# Altium schematic symbol library jlcpcb_2025_04_capacitors_extended_0402.schlib: 3594 symbols (part 8 of 20) (continued)
## CC0402JRX7R9BB151
designator C?  Capacitance: 150pF  (hidden comment: *)
Capacitor, Ceramic (MLCC), 150pF, ±5%, 50V, X7R, ±5%, SMD 0402; Manufacturer: YAGEO; Manufacturer Part Number: CC0402JRX7R9BB151; Package Size: 0402; JLCPCB Basic Part: No; JLCPCB Part Number: C541446; Supplier 1: LCSC; Category: Capacitors - MLCC; Supplier Part Number 1: C541446; Tolerance: ±5%; Voltage Rating: 50V; Temperature Coefficient: X7R; RoHS: Yes; ComponentLink1Description: Datasheet; ComponentLink1URL: https://wmsc.lcsc.com/wmsc/upload/file/pdf/v2/lcsc/2006151136_YAGEO-CC0402JRX7R9BB151_C541446.pdf; ComponentLink2Description: JLCPCB Part URL; ComponentLink2URL: https://jlcpcb.com/partdetail/C541446; ComponentLink3Description: LCSC Part URL; ComponentLink3URL: https://lcsc.com/product-detail/Multilayer-Ceramic-Capacitors-MLCC---SMD-SMT_YAGEO-YAGEO-CC0402JRX7R9BB151_C541446.html
footprint CAP-0402 (0402 (1005M) Capacitor)
pins: 1, 2

## CC0402JRX7R9BB152
designator C?  Capacitance: 1.5nF  (hidden comment: *)
Capacitor, Ceramic (MLCC), 1.5nF, ±5%, 50V, X7R, ±5%, SMD 0402; Manufacturer: YAGEO; Manufacturer Part Number: CC0402JRX7R9BB152; Package Size: 0402; JLCPCB Basic Part: No; JLCPCB Part Number: C281752; Supplier 1: LCSC; Category: Capacitors - MLCC; Supplier Part Number 1: C281752; Tolerance: ±5%; Voltage Rating: 50V; Temperature Coefficient: X7R; RoHS: Yes; ComponentLink1Description: Datasheet; ComponentLink1URL: https://wmsc.lcsc.com/wmsc/upload/file/pdf/v2/lcsc/2304140030_YAGEO-CC0402JRX7R9BB152_C281752.pdf; ComponentLink2Description: JLCPCB Part URL; ComponentLink2URL: https://jlcpcb.com/partdetail/C281752; ComponentLink3Description: LCSC Part URL; ComponentLink3URL: https://lcsc.com/product-detail/Multilayer-Ceramic-Capacitors-MLCC---SMD-SMT_YAGEO-YAGEO-CC0402JRX7R9BB152_C281752.html
footprint CAP-0402 (0402 (1005M) Capacitor)
pins: 1, 2

## CC0402JRX7R9BB153
designator C?  Capacitance: 15000pF  (hidden comment: *)
Capacitor, Ceramic (MLCC), 15000pF, null, SMD 0402; Manufacturer: YAGEO; Manufacturer Part Number: CC0402JRX7R9BB153; Package Size: 0402; JLCPCB Basic Part: No; JLCPCB Part Number: C5182422; Supplier 1: LCSC; Category: Capacitors - MLCC; Supplier Part Number 1: C5182422; Voltage Rating: null; RoHS: Yes; ComponentLink1Description: Datasheet; ComponentLink1URL: https://wmsc.lcsc.com/wmsc/upload/file/pdf/v2/lcsc/2211281000_YAGEO-CC0402JRX7R9BB153_C5182422.pdf; ComponentLink2Description: JLCPCB Part URL; ComponentLink2URL: https://jlcpcb.com/partdetail/C5182422; ComponentLink3Description: LCSC Part URL; ComponentLink3URL: https://lcsc.com/product-detail/Multilayer-Ceramic-Capacitors-MLCC---SMD-SMT_YAGEO-YAGEO-CC0402JRX7R9BB153_C5182422.html
footprint CAP-0402 (0402 (1005M) Capacitor)
pins: 1, 2

## CC0402JRX7R9BB182
designator C?  Capacitance: 1.8nF  (hidden comment: *)
Capacitor, Ceramic (MLCC), 1.8nF, ±5%, 50V, X7R, ±5%, SMD 0402; Manufacturer: YAGEO; Manufacturer Part Number: CC0402JRX7R9BB182; Package Size: 0402; JLCPCB Basic Part: No; JLCPCB Part Number: C527007; Supplier 1: LCSC; Category: Capacitors - MLCC; Supplier Part Number 1: C527007; Tolerance: ±5%; Voltage Rating: 50V; Temperature Coefficient: X7R; RoHS: Yes; ComponentLink1Description: Datasheet; ComponentLink1URL: https://wmsc.lcsc.com/wmsc/upload/file/pdf/v2/lcsc/2008061533_YAGEO-CC0402JRX7R9BB182_C527007.pdf; ComponentLink2Description: JLCPCB Part URL; ComponentLink2URL: https://jlcpcb.com/partdetail/C527007; ComponentLink3Description: LCSC Part URL; ComponentLink3URL: https://lcsc.com/product-detail/Multilayer-Ceramic-Capacitors-MLCC---SMD-SMT_YAGEO-YAGEO-CC0402JRX7R9BB182_C527007.html
footprint CAP-0402 (0402 (1005M) Capacitor)
pins: 1, 2

## CC0402JRX7R9BB202
designator C?  Capacitance: 2nF  (hidden comment: *)
Capacitor, Ceramic (MLCC), 2nF, ±5%, 50V, X7R, ±5%, SMD 0402; Manufacturer: YAGEO; Manufacturer Part Number: CC0402JRX7R9BB202; Package Size: 0402; JLCPCB Basic Part: No; JLCPCB Part Number: C541458; Supplier 1: LCSC; Category: Capacitors - MLCC; Supplier Part Number 1: C541458; Tolerance: ±5%; Voltage Rating: 50V; Temperature Coefficient: X7R; RoHS: Yes; ComponentLink1Description: Datasheet; ComponentLink1URL: https://wmsc.lcsc.com/wmsc/upload/file/pdf/v2/lcsc/2006151137_YAGEO-CC0402JRX7R9BB202_C541458.pdf; ComponentLink2Description: JLCPCB Part URL; ComponentLink2URL: https://jlcpcb.com/partdetail/C541458; ComponentLink3Description: LCSC Part URL; ComponentLink3URL: https://lcsc.com/product-detail/Multilayer-Ceramic-Capacitors-MLCC---SMD-SMT_YAGEO-YAGEO-CC0402JRX7R9BB202_C541458.html
footprint CAP-0402 (0402 (1005M) Capacitor)
pins: 1, 2

## CC0402JRX7R9BB222
designator C?  Capacitance: 2.2nF  (hidden comment: *)
Capacitor, Ceramic (MLCC), 2.2nF, ±5%, 50V, X7R, ±5%, SMD 0402; Manufacturer: YAGEO; Manufacturer Part Number: CC0402JRX7R9BB222; Package Size: 0402; JLCPCB Basic Part: No; JLCPCB Part Number: C513667; Supplier 1: LCSC; Category: Capacitors - MLCC; Supplier Part Number 1: C513667; Tolerance: ±5%; Voltage Rating: 50V; Temperature Coefficient: X7R; RoHS: Yes; ComponentLink1Description: Datasheet; ComponentLink1URL: https://wmsc.lcsc.com/wmsc/upload/file/pdf/v2/lcsc/2004231433_YAGEO-CC0402JRX7R9BB222_C513667.pdf; ComponentLink2Description: JLCPCB Part URL; ComponentLink2URL: https://jlcpcb.com/partdetail/C513667; ComponentLink3Description: LCSC Part URL; ComponentLink3URL: https://lcsc.com/product-detail/Multilayer-Ceramic-Capacitors-MLCC---SMD-SMT_YAGEO-YAGEO-CC0402JRX7R9BB222_C513667.html
footprint CAP-0402 (0402 (1005M) Capacitor)
pins: 1, 2

## CC0402JRX7R9BB223
designator C?  Capacitance: 22nF  (hidden comment: *)
Capacitor, Ceramic (MLCC), 22nF, ±5%, 50V, X7R, ±5%, SMD 0402; Manufacturer: YAGEO; Manufacturer Part Number: CC0402JRX7R9BB223; Package Size: 0402; JLCPCB Basic Part: No; JLCPCB Part Number: C541460; Supplier 1: LCSC; Category: Capacitors - MLCC; Supplier Part Number 1: C541460; Tolerance: ±5%; Voltage Rating: 50V; Temperature Coefficient: X7R; RoHS: Yes; ComponentLink1Description: Datasheet; ComponentLink1URL: https://wmsc.lcsc.com/wmsc/upload/file/pdf/v2/lcsc/2006151138_YAGEO-CC0402JRX7R9BB223_C541460.pdf; ComponentLink2Description: JLCPCB Part URL; ComponentLink2URL: https://jlcpcb.com/partdetail/C541460; ComponentLink3Description: LCSC Part URL; ComponentLink3URL: https://lcsc.com/product-detail/Multilayer-Ceramic-Capacitors-MLCC---SMD-SMT_YAGEO-YAGEO-CC0402JRX7R9BB223_C541460.html
footprint CAP-0402 (0402 (1005M) Capacitor)
pins: 1, 2

## CC0402JRX7R9BB271
designator C?  Capacitance: 270pF  (hidden comment: *)
Capacitor, Ceramic (MLCC), 270pF, ±5%, 50V, X7R, ±5%, SMD 0402; Manufacturer: YAGEO; Manufacturer Part Number: CC0402JRX7R9BB271; Package Size: 0402; JLCPCB Basic Part: No; JLCPCB Part Number: C541454; Supplier 1: LCSC; Category: Capacitors - MLCC; Supplier Part Number 1: C541454; Tolerance: ±5%; Voltage Rating: 50V; Temperature Coefficient: X7R; RoHS: Yes; ComponentLink1Description: Datasheet; ComponentLink1URL: https://wmsc.lcsc.com/wmsc/upload/file/pdf/v2/lcsc/2006151137_YAGEO-CC0402JRX7R9BB271_C541454.pdf; ComponentLink2Description: JLCPCB Part URL; ComponentLink2URL: https://jlcpcb.com/partdetail/C541454; ComponentLink3Description: LCSC Part URL; ComponentLink3URL: https://lcsc.com/product-detail/Multilayer-Ceramic-Capacitors-MLCC---SMD-SMT_YAGEO-YAGEO-CC0402JRX7R9BB271_C541454.html
footprint CAP-0402 (0402 (1005M) Capacitor)
pins: 1, 2

## CC0402JRX7R9BB272
designator C?  Capacitance: 2.7nF  (hidden comment: *)
Capacitor, Ceramic (MLCC), 2.7nF, ±5%, 50V, X7R, ±5%, SMD 0402; Manufacturer: YAGEO; Manufacturer Part Number: CC0402JRX7R9BB272; Package Size: 0402; JLCPCB Basic Part: No; JLCPCB Part Number: C327272; Supplier 1: LCSC; Category: Capacitors - MLCC; Supplier Part Number 1: C327272; Tolerance: ±5%; Voltage Rating: 50V; Temperature Coefficient: X7R; RoHS: Yes; ComponentLink1Description: Datasheet; ComponentLink1URL: https://wmsc.lcsc.com/wmsc/upload/file/pdf/v2/lcsc/2311211121_YAGEO-CC0402JRX7R9BB272_C327272.pdf; ComponentLink2Description: JLCPCB Part URL; ComponentLink2URL: https://jlcpcb.com/partdetail/C327272; ComponentLink3Description: LCSC Part URL; ComponentLink3URL: https://lcsc.com/product-detail/Multilayer-Ceramic-Capacitors-MLCC---SMD-SMT_YAGEO-YAGEO-CC0402JRX7R9BB272_C327272.html
footprint CAP-0402 (0402 (1005M) Capacitor)
pins: 1, 2

## CC0402JRX7R9BB331
designator C?  Capacitance: 330pF  (hidden comment: *)
Capacitor, Ceramic (MLCC), 330pF, ±5%, 50V, X7R, ±5%, SMD 0402; Manufacturer: YAGEO; Manufacturer Part Number: CC0402JRX7R9BB331; Package Size: 0402; JLCPCB Basic Part: No; JLCPCB Part Number: C325463; Supplier 1: LCSC; Category: Capacitors - MLCC; Supplier Part Number 1: C325463; Tolerance: ±5%; Voltage Rating: 50V; Temperature Coefficient: X7R; RoHS: Yes; ComponentLink1Description: Datasheet; ComponentLink1URL: https://wmsc.lcsc.com/wmsc/upload/file/pdf/v2/lcsc/1811070918_YAGEO-CC0402JRX7R9BB331_C325463.pdf; ComponentLink2Description: JLCPCB Part URL; ComponentLink2URL: https://jlcpcb.com/partdetail/C325463; ComponentLink3Description: LCSC Part URL; ComponentLink3URL: https://lcsc.com/product-detail/Multilayer-Ceramic-Capacitors-MLCC---SMD-SMT_YAGEO-YAGEO-CC0402JRX7R9BB331_C325463.html
footprint CAP-0402 (0402 (1005M) Capacitor)
pins: 1, 2

## CC0402JRX7R9BB332
designator C?  Capacitance: 3.3nF  (hidden comment: *)
Capacitor, Ceramic (MLCC), 3.3nF, ±5%, 50V, X7R, ±5%, SMD 0402; Manufacturer: YAGEO; Manufacturer Part Number: CC0402JRX7R9BB332; Package Size: 0402; JLCPCB Basic Part: No; JLCPCB Part Number: C541447; Supplier 1: LCSC; Category: Capacitors - MLCC; Supplier Part Number 1: C541447; Tolerance: ±5%; Voltage Rating: 50V; Temperature Coefficient: X7R; RoHS: Yes; ComponentLink1Description: Datasheet; ComponentLink1URL: https://wmsc.lcsc.com/wmsc/upload/file/pdf/v2/lcsc/2006151136_YAGEO-CC0402JRX7R9BB332_C541447.pdf; ComponentLink2Description: JLCPCB Part URL; ComponentLink2URL: https://jlcpcb.com/partdetail/C541447; ComponentLink3Description: LCSC Part URL; ComponentLink3URL: https://lcsc.com/product-detail/Multilayer-Ceramic-Capacitors-MLCC---SMD-SMT_YAGEO-YAGEO-CC0402JRX7R9BB332_C541447.html
footprint CAP-0402 (0402 (1005M) Capacitor)
pins: 1, 2

## CC0402JRX7R9BB333
designator C?  Capacitance: 33nF  (hidden comment: *)
Capacitor, Ceramic (MLCC), 33nF, ±5%, 50V, X7R, ±5%, SMD 0402; Manufacturer: YAGEO; Manufacturer Part Number: CC0402JRX7R9BB333; Package Size: 0402; JLCPCB Basic Part: No; JLCPCB Part Number: C541463; Supplier 1: LCSC; Category: Capacitors - MLCC; Supplier Part Number 1: C541463; Tolerance: ±5%; Voltage Rating: 50V; Temperature Coefficient: X7R; RoHS: Yes; ComponentLink1Description: Datasheet; ComponentLink1URL: https://wmsc.lcsc.com/wmsc/upload/file/pdf/v2/lcsc/2006151138_YAGEO-CC0402JRX7R9BB333_C541463.pdf; ComponentLink2Description: JLCPCB Part URL; ComponentLink2URL: https://jlcpcb.com/partdetail/C541463; ComponentLink3Description: LCSC Part URL; ComponentLink3URL: https://lcsc.com/product-detail/Multilayer-Ceramic-Capacitors-MLCC---SMD-SMT_YAGEO-YAGEO-CC0402JRX7R9BB333_C541463.html
footprint CAP-0402 (0402 (1005M) Capacitor)
pins: 1, 2

## CC0402JRX7R9BB391
designator C?  Capacitance: 390pF  (hidden comment: *)
Capacitor, Ceramic (MLCC), 390pF, ±5%, 50V, X7R, ±5%, SMD 0402; Manufacturer: YAGEO; Manufacturer Part Number: CC0402JRX7R9BB391; Package Size: 0402; JLCPCB Basic Part: No; JLCPCB Part Number: C527008; Supplier 1: LCSC; Category: Capacitors - MLCC; Supplier Part Number 1: C527008; Tolerance: ±5%; Voltage Rating: 50V; Temperature Coefficient: X7R; RoHS: Yes; ComponentLink1Description: Datasheet; ComponentLink1URL: https://wmsc.lcsc.com/wmsc/upload/file/pdf/v2/lcsc/2006101834_YAGEO-CC0402JRX7R9BB391_C527008.pdf; ComponentLink2Description: JLCPCB Part URL; ComponentLink2URL: https://jlcpcb.com/partdetail/C527008; ComponentLink3Description: LCSC Part URL; ComponentLink3URL: https://lcsc.com/product-detail/Multilayer-Ceramic-Capacitors-MLCC---SMD-SMT_YAGEO-YAGEO-CC0402JRX7R9BB391_C527008.html
footprint CAP-0402 (0402 (1005M) Capacitor)
pins: 1, 2

## CC0402JRX7R9BB392
designator C?  Capacitance: 3.9nF  (hidden comment: *)
Capacitor, Ceramic (MLCC), 3.9nF, ±5%, 50V, X7R, ±5%, SMD 0402; Manufacturer: YAGEO; Manufacturer Part Number: CC0402JRX7R9BB392; Package Size: 0402; JLCPCB Basic Part: No; JLCPCB Part Number: C541455; Supplier 1: LCSC; Category: Capacitors - MLCC; Supplier Part Number 1: C541455; Tolerance: ±5%; Voltage Rating: 50V; Temperature Coefficient: X7R; RoHS: Yes; ComponentLink1Description: Datasheet; ComponentLink1URL: https://wmsc.lcsc.com/wmsc/upload/file/pdf/v2/lcsc/2006151137_YAGEO-CC0402JRX7R9BB392_C541455.pdf; ComponentLink2Description: JLCPCB Part URL; ComponentLink2URL: https://jlcpcb.com/partdetail/C541455; ComponentLink3Description: LCSC Part URL; ComponentLink3URL: https://lcsc.com/product-detail/Multilayer-Ceramic-Capacitors-MLCC---SMD-SMT_YAGEO-YAGEO-CC0402JRX7R9BB392_C541455.html
footprint CAP-0402 (0402 (1005M) Capacitor)
pins: 1, 2

## CC0402JRX7R9BB471
designator C?  Capacitance: 470pF  (hidden comment: *)
Capacitor, Ceramic (MLCC), 470pF, ±5%, 50V, X7R, ±5%, SMD 0402; Manufacturer: YAGEO; Manufacturer Part Number: CC0402JRX7R9BB471; Package Size: 0402; JLCPCB Basic Part: No; JLCPCB Part Number: C272887; Supplier 1: LCSC; Category: Capacitors - MLCC; Supplier Part Number 1: C272887; Tolerance: ±5%; Voltage Rating: 50V; Temperature Coefficient: X7R; RoHS: Yes; ComponentLink1Description: Datasheet; ComponentLink1URL: https://wmsc.lcsc.com/wmsc/upload/file/pdf/v2/lcsc/2304140030_YAGEO-CC0402JRX7R9BB471_C272887.pdf; ComponentLink2Description: JLCPCB Part URL; ComponentLink2URL: https://jlcpcb.com/partdetail/C272887; ComponentLink3Description: LCSC Part URL; ComponentLink3URL: https://lcsc.com/product-detail/Multilayer-Ceramic-Capacitors-MLCC---SMD-SMT_YAGEO-YAGEO-CC0402JRX7R9BB471_C272887.html
footprint CAP-0402 (0402 (1005M) Capacitor)
pins: 1, 2

## CC0402JRX7R9BB472
designator C?  Capacitance: 4.7nF  (hidden comment: *)
Capacitor, Ceramic (MLCC), 4.7nF, ±5%, 50V, X7R, ±5%, SMD 0402; Manufacturer: YAGEO; Manufacturer Part Number: CC0402JRX7R9BB472; Package Size: 0402; JLCPCB Basic Part: No; JLCPCB Part Number: C281757; Supplier 1: LCSC; Category: Capacitors - MLCC; Supplier Part Number 1: C281757; Tolerance: ±5%; Voltage Rating: 50V; Temperature Coefficient: X7R; RoHS: Yes; ComponentLink1Description: Datasheet; ComponentLink1URL: https://wmsc.lcsc.com/wmsc/upload/file/pdf/v2/lcsc/2304140030_YAGEO-CC0402JRX7R9BB472_C281757.pdf; ComponentLink2Description: JLCPCB Part URL; ComponentLink2URL: https://jlcpcb.com/partdetail/C281757; ComponentLink3Description: LCSC Part URL; ComponentLink3URL: https://lcsc.com/product-detail/Multilayer-Ceramic-Capacitors-MLCC---SMD-SMT_YAGEO-YAGEO-CC0402JRX7R9BB472_C281757.html
footprint CAP-0402 (0402 (1005M) Capacitor)
pins: 1, 2

## CC0402JRX7R9BB473
designator C?  Capacitance: 47nF  (hidden comment: *)
Capacitor, Ceramic (MLCC), 47nF, ±5%, 50V, X7R, ±5%, SMD 0402; Manufacturer: YAGEO; Manufacturer Part Number: CC0402JRX7R9BB473; Package Size: 0402; JLCPCB Basic Part: No; JLCPCB Part Number: C576715; Supplier 1: LCSC; Category: Capacitors - MLCC; Supplier Part Number 1: C576715; Tolerance: ±5%; Voltage Rating: 50V; Temperature Coefficient: X7R; RoHS: Yes; ComponentLink1Description: Datasheet; ComponentLink1URL: https://wmsc.lcsc.com/wmsc/upload/file/pdf/v2/lcsc/2205071500_YAGEO-CC0402JRX7R9BB473_C576715.pdf; ComponentLink2Description: JLCPCB Part URL; ComponentLink2URL: https://jlcpcb.com/partdetail/C576715; ComponentLink3Description: LCSC Part URL; ComponentLink3URL: https://lcsc.com/product-detail/Multilayer-Ceramic-Capacitors-MLCC---SMD-SMT_YAGEO-YAGEO-CC0402JRX7R9BB473_C576715.html
footprint CAP-0402 (0402 (1005M) Capacitor)
pins: 1, 2

## CC0402JRX7R9BB561
designator C?  Capacitance: 560pF  (hidden comment: *)
Capacitor, Ceramic (MLCC), 560pF, ±5%, 50V, X7R, ±5%, SMD 0402; Manufacturer: YAGEO; Manufacturer Part Number: CC0402JRX7R9BB561; Package Size: 0402; JLCPCB Basic Part: No; JLCPCB Part Number: C541456; Supplier 1: LCSC; Category: Capacitors - MLCC; Supplier Part Number 1: C541456; Tolerance: ±5%; Voltage Rating: 50V; Temperature Coefficient: X7R; RoHS: Yes; ComponentLink1Description: Datasheet; ComponentLink1URL: https://wmsc.lcsc.com/wmsc/upload/file/pdf/v2/lcsc/2006151137_YAGEO-CC0402JRX7R9BB561_C541456.pdf; ComponentLink2Description: JLCPCB Part URL; ComponentLink2URL: https://jlcpcb.com/partdetail/C541456; ComponentLink3Description: LCSC Part URL; ComponentLink3URL: https://lcsc.com/product-detail/Multilayer-Ceramic-Capacitors-MLCC---SMD-SMT_YAGEO-YAGEO-CC0402JRX7R9BB561_C541456.html
footprint CAP-0402 (0402 (1005M) Capacitor)
pins: 1, 2

## CC0402JRX7R9BB562
designator C?  Capacitance: 5.6nF  (hidden comment: *)
Capacitor, Ceramic (MLCC), 5.6nF, ±5%, 50V, X7R, ±5%, SMD 0402; Manufacturer: YAGEO; Manufacturer Part Number: CC0402JRX7R9BB562; Package Size: 0402; JLCPCB Basic Part: No; JLCPCB Part Number: C513725; Supplier 1: LCSC; Category: Capacitors - MLCC; Supplier Part Number 1: C513725; Tolerance: ±5%; Voltage Rating: 50V; Temperature Coefficient: X7R; RoHS: Yes; ComponentLink1Description: Datasheet; ComponentLink1URL: https://wmsc.lcsc.com/wmsc/upload/file/pdf/v2/lcsc/2004231434_YAGEO-CC0402JRX7R9BB562_C513725.pdf; ComponentLink2Description: JLCPCB Part URL; ComponentLink2URL: https://jlcpcb.com/partdetail/C513725; ComponentLink3Description: LCSC Part URL; ComponentLink3URL: https://lcsc.com/product-detail/Multilayer-Ceramic-Capacitors-MLCC---SMD-SMT_YAGEO-YAGEO-CC0402JRX7R9BB562_C513725.html
footprint CAP-0402 (0402 (1005M) Capacitor)
pins: 1, 2

## CC0402JRX7R9BB681
designator C?  Capacitance: 680pF  (hidden comment: *)
Capacitor, Ceramic (MLCC), 680pF, ±5%, 50V, X7R, ±5%, SMD 0402; Manufacturer: YAGEO; Manufacturer Part Number: CC0402JRX7R9BB681; Package Size: 0402; JLCPCB Basic Part: No; JLCPCB Part Number: C513560; Supplier 1: LCSC; Category: Capacitors - MLCC; Supplier Part Number 1: C513560; Tolerance: ±5%; Voltage Rating: 50V; Temperature Coefficient: X7R; RoHS: Yes; ComponentLink1Description: Datasheet; ComponentLink1URL: https://wmsc.lcsc.com/wmsc/upload/file/pdf/v2/lcsc/2005142147_YAGEO-CC0402JRX7R9BB681_C513560.pdf; ComponentLink2Description: JLCPCB Part URL; ComponentLink2URL: https://jlcpcb.com/partdetail/C513560; ComponentLink3Description: LCSC Part URL; ComponentLink3URL: https://lcsc.com/product-detail/Multilayer-Ceramic-Capacitors-MLCC---SMD-SMT_YAGEO-YAGEO-CC0402JRX7R9BB681_C513560.html
footprint CAP-0402 (0402 (1005M) Capacitor)
pins: 1, 2

## CC0402JRX7R9BB821
designator C?  Capacitance: 820pF  (hidden comment: *)
Capacitor, Ceramic (MLCC), 820pF, ±5%, 50V, X7R, ±5%, SMD 0402; Manufacturer: YAGEO; Manufacturer Part Number: CC0402JRX7R9BB821; Package Size: 0402; JLCPCB Basic Part: No; JLCPCB Part Number: C114386; Supplier 1: LCSC; Category: Capacitors - MLCC; Supplier Part Number 1: C114386; Tolerance: ±5%; Voltage Rating: 50V; Temperature Coefficient: X7R; RoHS: Yes; ComponentLink1Description: Datasheet; ComponentLink1URL: https://wmsc.lcsc.com/wmsc/upload/file/pdf/v2/lcsc/2304140030_YAGEO-CC0402JRX7R9BB821_C114386.pdf; ComponentLink2Description: JLCPCB Part URL; ComponentLink2URL: https://jlcpcb.com/partdetail/C114386; ComponentLink3Description: LCSC Part URL; ComponentLink3URL: https://lcsc.com/product-detail/Multilayer-Ceramic-Capacitors-MLCC---SMD-SMT_YAGEO-YAGEO-CC0402JRX7R9BB821_C114386.html
footprint CAP-0402 (0402 (1005M) Capacitor)
pins: 1, 2

## CC0402JRX7R9BB822
designator C?  Capacitance: 8.2nF  (hidden comment: *)
Capacitor, Ceramic (MLCC), 8.2nF, ±5%, 50V, X7R, ±5%, SMD 0402; Manufacturer: YAGEO; Manufacturer Part Number: CC0402JRX7R9BB822; Package Size: 0402; JLCPCB Basic Part: No; JLCPCB Part Number: C541457; Supplier 1: LCSC; Category: Capacitors - MLCC; Supplier Part Number 1: C541457; Tolerance: ±5%; Voltage Rating: 50V; Temperature Coefficient: X7R; RoHS: Yes; ComponentLink1Description: Datasheet; ComponentLink1URL: https://wmsc.lcsc.com/wmsc/upload/file/pdf/v2/lcsc/2006151137_YAGEO-CC0402JRX7R9BB822_C541457.pdf; ComponentLink2Description: JLCPCB Part URL; ComponentLink2URL: https://jlcpcb.com/partdetail/C541457; ComponentLink3Description: LCSC Part URL; ComponentLink3URL: https://lcsc.com/product-detail/Multilayer-Ceramic-Capacitors-MLCC---SMD-SMT_YAGEO-YAGEO-CC0402JRX7R9BB822_C541457.html
footprint CAP-0402 (0402 (1005M) Capacitor)
pins: 1, 2

## CC0402KRNPO7BN100
designator C?  Capacitance: 10pF  (hidden comment: *)
Capacitor, Ceramic (MLCC), 10pF, ±10%, 16V, NP0, ±10%, SMD 0402; Manufacturer: YAGEO; Manufacturer Part Number: CC0402KRNPO7BN100; Package Size: 0402; JLCPCB Basic Part: No; JLCPCB Part Number: C2168196; Supplier 1: LCSC; Category: Capacitors - MLCC; Supplier Part Number 1: C2168196; Tolerance: ±10%; Voltage Rating: 16V; Temperature Coefficient: NP0; RoHS: Yes; ComponentLink1Description: Datasheet; ComponentLink1URL: https://wmsc.lcsc.com/wmsc/upload/file/pdf/v2/lcsc/2202040300_YAGEO-CC0402KRNPO7BN100_C2168196.pdf; ComponentLink2Description: JLCPCB Part URL; ComponentLink2URL: https://jlcpcb.com/partdetail/C2168196; ComponentLink3Description: LCSC Part URL; ComponentLink3URL: https://lcsc.com/product-detail/Multilayer-Ceramic-Capacitors-MLCC---SMD-SMT_YAGEO-YAGEO-CC0402KRNPO7BN100_C2168196.html
footprint CAP-0402 (0402 (1005M) Capacitor)
pins: 1, 2

## CC0402KRNPO7BN150
designator C?  Capacitance: 15pF  (hidden comment: *)
Capacitor, Ceramic (MLCC), 15pF, ±10%, 16V, NP0, ±10%, SMD 0402; Manufacturer: YAGEO; Manufacturer Part Number: CC0402KRNPO7BN150; Package Size: 0402; JLCPCB Basic Part: No; JLCPCB Part Number: C1852854; Supplier 1: LCSC; Category: Capacitors - MLCC; Supplier Part Number 1: C1852854; Tolerance: ±10%; Voltage Rating: 16V; Temperature Coefficient: NP0; RoHS: Yes; ComponentLink1Description: Datasheet; ComponentLink1URL: https://wmsc.lcsc.com/wmsc/upload/file/pdf/v2/lcsc/2201271000_YAGEO-CC0402KRNPO7BN150_C1852854.pdf; ComponentLink2Description: JLCPCB Part URL; ComponentLink2URL: https://jlcpcb.com/partdetail/C1852854; ComponentLink3Description: LCSC Part URL; ComponentLink3URL: https://lcsc.com/product-detail/Multilayer-Ceramic-Capacitors-MLCC---SMD-SMT_YAGEO-YAGEO-CC0402KRNPO7BN150_C1852854.html
footprint CAP-0402 (0402 (1005M) Capacitor)
pins: 1, 2

## CC0402KRNPO8BN100
designator C?  Capacitance: 10pF  (hidden comment: *)
Capacitor, Ceramic (MLCC), 10pF, ±10%, 25V, NP0, ±10%, SMD 0402; Manufacturer: YAGEO; Manufacturer Part Number: CC0402KRNPO8BN100; Package Size: 0402; JLCPCB Basic Part: No; JLCPCB Part Number: C2168222; Supplier 1: LCSC; Category: Capacitors - MLCC; Supplier Part Number 1: C2168222; Tolerance: ±10%; Voltage Rating: 25V; Temperature Coefficient: NP0; RoHS: Yes; ComponentLink1Description: Datasheet; ComponentLink1URL: https://wmsc.lcsc.com/wmsc/upload/file/pdf/v2/lcsc/2202040300_YAGEO-CC0402KRNPO8BN100_C2168222.pdf; ComponentLink2Description: JLCPCB Part URL; ComponentLink2URL: https://jlcpcb.com/partdetail/C2168222; ComponentLink3Description: LCSC Part URL; ComponentLink3URL: https://lcsc.com/product-detail/Multilayer-Ceramic-Capacitors-MLCC---SMD-SMT_YAGEO-YAGEO-CC0402KRNPO8BN100_C2168222.html
footprint CAP-0402 (0402 (1005M) Capacitor)
pins: 1, 2

## CC0402KRNPO8BN220
designator C?  Capacitance: 22pF  (hidden comment: *)
Capacitor, Ceramic (MLCC), 22pF, ±10%, 25V, NP0, ±10%, SMD 0402; Manufacturer: YAGEO; Manufacturer Part Number: CC0402KRNPO8BN220; Package Size: 0402; JLCPCB Basic Part: No; JLCPCB Part Number: C1852900; Supplier 1: LCSC; Category: Capacitors - MLCC; Supplier Part Number 1: C1852900; Tolerance: ±10%; Voltage Rating: 25V; Temperature Coefficient: NP0; RoHS: Yes; ComponentLink1Description: Datasheet; ComponentLink1URL: https://wmsc.lcsc.com/wmsc/upload/file/pdf/v2/lcsc/2201271030_YAGEO-CC0402KRNPO8BN220_C1852900.pdf; ComponentLink2Description: JLCPCB Part URL; ComponentLink2URL: https://jlcpcb.com/partdetail/C1852900; ComponentLink3Description: LCSC Part URL; ComponentLink3URL: https://lcsc.com/product-detail/Multilayer-Ceramic-Capacitors-MLCC---SMD-SMT_YAGEO-YAGEO-CC0402KRNPO8BN220_C1852900.html
footprint CAP-0402 (0402 (1005M) Capacitor)
pins: 1, 2

## CC0402KRNPO9BN100
designator C?  Capacitance: 10pF  (hidden comment: *)
Capacitor, Ceramic (MLCC), 10pF, ±10%, 50V, NP0, ±10%, SMD 0402; Manufacturer: YAGEO; Manufacturer Part Number: CC0402KRNPO9BN100; Package Size: 0402; JLCPCB Basic Part: No; JLCPCB Part Number: C1853206; Supplier 1: LCSC; Category: Capacitors - MLCC; Supplier Part Number 1: C1853206; Tolerance: ±10%; Voltage Rating: 50V; Temperature Coefficient: NP0; RoHS: Yes; ComponentLink1Description: Datasheet; ComponentLink1URL: https://wmsc.lcsc.com/wmsc/upload/file/pdf/v2/lcsc/2201271030_YAGEO-CC0402KRNPO9BN100_C1853206.pdf; ComponentLink2Description: JLCPCB Part URL; ComponentLink2URL: https://jlcpcb.com/partdetail/C1853206; ComponentLink3Description: LCSC Part URL; ComponentLink3URL: https://lcsc.com/product-detail/Multilayer-Ceramic-Capacitors-MLCC---SMD-SMT_YAGEO-YAGEO-CC0402KRNPO9BN100_C1853206.html
footprint CAP-0402 (0402 (1005M) Capacitor)
pins: 1, 2

## CC0402KRNPO9BN101
designator C?  Capacitance: 100pF  (hidden comment: *)
Capacitor, Ceramic (MLCC), 100pF, ±10%, 50V, NP0, ±10%, SMD 0402; Manufacturer: YAGEO; Manufacturer Part Number: CC0402KRNPO9BN101; Package Size: 0402; JLCPCB Basic Part: No; JLCPCB Part Number: C2180497; Supplier 1: LCSC; Category: Capacitors - MLCC; Supplier Part Number 1: C2180497; Tolerance: ±10%; Voltage Rating: 50V; Temperature Coefficient: NP0; RoHS: Yes; ComponentLink1Description: Datasheet; ComponentLink1URL: https://wmsc.lcsc.com/wmsc/upload/file/pdf/v2/lcsc/2202041130_YAGEO-CC0402KRNPO9BN101_C2180497.pdf; ComponentLink2Description: JLCPCB Part URL; ComponentLink2URL: https://jlcpcb.com/partdetail/C2180497; ComponentLink3Description: LCSC Part URL; ComponentLink3URL: https://lcsc.com/product-detail/Multilayer-Ceramic-Capacitors-MLCC---SMD-SMT_YAGEO-YAGEO-CC0402KRNPO9BN101_C2180497.html
footprint CAP-0402 (0402 (1005M) Capacitor)
pins: 1, 2

## CC0402KRNPO9BN120
designator C?  Capacitance: 12pF  (hidden comment: *)
Capacitor, Ceramic (MLCC), 12pF, ±10%, 50V, NP0, ±10%, SMD 0402; Manufacturer: YAGEO; Manufacturer Part Number: CC0402KRNPO9BN120; Package Size: 0402; JLCPCB Basic Part: No; JLCPCB Part Number: C1852889; Supplier 1: LCSC; Category: Capacitors - MLCC; Supplier Part Number 1: C1852889; Tolerance: ±10%; Voltage Rating: 50V; Temperature Coefficient: NP0; RoHS: Yes; ComponentLink1Description: Datasheet; ComponentLink1URL: https://wmsc.lcsc.com/wmsc/upload/file/pdf/v2/lcsc/2201271030_YAGEO-CC0402KRNPO9BN120_C1852889.pdf; ComponentLink2Description: JLCPCB Part URL; ComponentLink2URL: https://jlcpcb.com/partdetail/C1852889; ComponentLink3Description: LCSC Part URL; ComponentLink3URL: https://lcsc.com/product-detail/Multilayer-Ceramic-Capacitors-MLCC---SMD-SMT_YAGEO-YAGEO-CC0402KRNPO9BN120_C1852889.html
footprint CAP-0402 (0402 (1005M) Capacitor)
pins: 1, 2

## CC0402KRNPO9BN150
designator C?  Capacitance: 15pF  (hidden comment: *)
Capacitor, Ceramic (MLCC), 15pF, ±10%, 50V, C0G, ±10%, SMD 0402; Manufacturer: YAGEO; Manufacturer Part Number: CC0402KRNPO9BN150; Package Size: 0402; JLCPCB Basic Part: No; JLCPCB Part Number: C3906764; Supplier 1: LCSC; Category: Capacitors - MLCC; Supplier Part Number 1: C3906764; Tolerance: ±10%; Voltage Rating: 50V; Temperature Coefficient: C0G; RoHS: Yes; ComponentLink1Description: Datasheet; ComponentLink1URL: https://wmsc.lcsc.com/wmsc/upload/file/pdf/v2/lcsc/2311211121_YAGEO-CC0402KRNPO9BN150_C3906764.pdf; ComponentLink2Description: JLCPCB Part URL; ComponentLink2URL: https://jlcpcb.com/partdetail/C3906764; ComponentLink3Description: LCSC Part URL; ComponentLink3URL: https://lcsc.com/product-detail/Multilayer-Ceramic-Capacitors-MLCC---SMD-SMT_YAGEO-YAGEO-CC0402KRNPO9BN150_C3906764.html
footprint CAP-0402 (0402 (1005M) Capacitor)
pins: 1, 2

## CC0402KRNPO9BN180
designator C?  Capacitance: 18pF  (hidden comment: *)
Capacitor, Ceramic (MLCC), 18pF, ±10%, 50V, C0G, ±10%, SMD 0402; Manufacturer: YAGEO; Manufacturer Part Number: CC0402KRNPO9BN180; Package Size: 0402; JLCPCB Basic Part: No; JLCPCB Part Number: C3872258; Supplier 1: LCSC; Category: Capacitors - MLCC; Supplier Part Number 1: C3872258; Tolerance: ±10%; Voltage Rating: 50V; Temperature Coefficient: C0G; RoHS: Yes; ComponentLink1Description: Datasheet; ComponentLink1URL: https://wmsc.lcsc.com/wmsc/upload/file/pdf/v2/lcsc/2311211121_YAGEO-CC0402KRNPO9BN180_C3872258.pdf; ComponentLink2Description: JLCPCB Part URL; ComponentLink2URL: https://jlcpcb.com/partdetail/C3872258; ComponentLink3Description: LCSC Part URL; ComponentLink3URL: https://lcsc.com/product-detail/Multilayer-Ceramic-Capacitors-MLCC---SMD-SMT_YAGEO-YAGEO-CC0402KRNPO9BN180_C3872258.html
footprint CAP-0402 (0402 (1005M) Capacitor)
pins: 1, 2

## CC0402KRNPO9BN220
designator C?  Capacitance: 22pF  (hidden comment: *)
Capacitor, Ceramic (MLCC), 22pF, ±10%, 50V, NP0, ±10%, SMD 0402; Manufacturer: YAGEO; Manufacturer Part Number: CC0402KRNPO9BN220; Package Size: 0402; JLCPCB Basic Part: No; JLCPCB Part Number: C2168187; Supplier 1: LCSC; Category: Capacitors - MLCC; Supplier Part Number 1: C2168187; Tolerance: ±10%; Voltage Rating: 50V; Temperature Coefficient: NP0; RoHS: Yes; ComponentLink1Description: Datasheet; ComponentLink1URL: https://wmsc.lcsc.com/wmsc/upload/file/pdf/v2/lcsc/2202040300_YAGEO-CC0402KRNPO9BN220_C2168187.pdf; ComponentLink2Description: JLCPCB Part URL; ComponentLink2URL: https://jlcpcb.com/partdetail/C2168187; ComponentLink3Description: LCSC Part URL; ComponentLink3URL: https://lcsc.com/product-detail/Multilayer-Ceramic-Capacitors-MLCC---SMD-SMT_YAGEO-YAGEO-CC0402KRNPO9BN220_C2168187.html
footprint CAP-0402 (0402 (1005M) Capacitor)
pins: 1, 2

## CC0402KRNPO9BN221
designator C?  Capacitance: 220pF  (hidden comment: *)
Capacitor, Ceramic (MLCC), 220pF, ±10%, 50V, NP0, ±10%, SMD 0402; Manufacturer: YAGEO; Manufacturer Part Number: CC0402KRNPO9BN221; Package Size: 0402; JLCPCB Basic Part: No; JLCPCB Part Number: C281754; Supplier 1: LCSC; Category: Capacitors - MLCC; Supplier Part Number 1: C281754; Tolerance: ±10%; Voltage Rating: 50V; Temperature Coefficient: NP0; RoHS: Yes; ComponentLink1Description: Datasheet; ComponentLink1URL: https://wmsc.lcsc.com/wmsc/upload/file/pdf/v2/lcsc/2304140030_YAGEO-CC0402KRNPO9BN221_C281754.pdf; ComponentLink2Description: JLCPCB Part URL; ComponentLink2URL: https://jlcpcb.com/partdetail/C281754; ComponentLink3Description: LCSC Part URL; ComponentLink3URL: https://lcsc.com/product-detail/Multilayer-Ceramic-Capacitors-MLCC---SMD-SMT_YAGEO-YAGEO-CC0402KRNPO9BN221_C281754.html
footprint CAP-0402 (0402 (1005M) Capacitor)
pins: 1, 2

## CC0402KRNPO9BN330
designator C?  Capacitance: 33pF  (hidden comment: *)
Capacitor, Ceramic (MLCC), 33pF, ±10%, 50V, NP0, ±10%, SMD 0402; Manufacturer: YAGEO; Manufacturer Part Number: CC0402KRNPO9BN330; Package Size: 0402; JLCPCB Basic Part: No; JLCPCB Part Number: C576718; Supplier 1: LCSC; Category: Capacitors - MLCC; Supplier Part Number 1: C576718; Tolerance: ±10%; Voltage Rating: 50V; Temperature Coefficient: NP0; RoHS: Yes; ComponentLink1Description: Datasheet; ComponentLink1URL: https://wmsc.lcsc.com/wmsc/upload/file/pdf/v2/lcsc/2204021130_YAGEO-CC0402KRNPO9BN330_C576718.pdf; ComponentLink2Description: JLCPCB Part URL; ComponentLink2URL: https://jlcpcb.com/partdetail/C576718; ComponentLink3Description: LCSC Part URL; ComponentLink3URL: https://lcsc.com/product-detail/Multilayer-Ceramic-Capacitors-MLCC---SMD-SMT_YAGEO-YAGEO-CC0402KRNPO9BN330_C576718.html
footprint CAP-0402 (0402 (1005M) Capacitor)
pins: 1, 2

## CC0402KRNPO9BN470
designator C?  Capacitance: 47pF  (hidden comment: *)
Capacitor, Ceramic (MLCC), 47pF, ±10%, 50V, NP0, ±10%, SMD 0402; Manufacturer: YAGEO; Manufacturer Part Number: CC0402KRNPO9BN470; Package Size: 0402; JLCPCB Basic Part: No; JLCPCB Part Number: C527009; Supplier 1: LCSC; Category: Capacitors - MLCC; Supplier Part Number 1: C527009; Tolerance: ±10%; Voltage Rating: 50V; Temperature Coefficient: NP0; RoHS: Yes; ComponentLink1Description: Datasheet; ComponentLink1URL: https://wmsc.lcsc.com/wmsc/upload/file/pdf/v2/lcsc/2005261832_YAGEO-CC0402KRNPO9BN470_C527009.pdf; ComponentLink2Description: JLCPCB Part URL; ComponentLink2URL: https://jlcpcb.com/partdetail/C527009; ComponentLink3Description: LCSC Part URL; ComponentLink3URL: https://lcsc.com/product-detail/Multilayer-Ceramic-Capacitors-MLCC---SMD-SMT_YAGEO-YAGEO-CC0402KRNPO9BN470_C527009.html
footprint CAP-0402 (0402 (1005M) Capacitor)
pins: 1, 2

## CC0402KRNPO9BN680
designator C?  Capacitance: 68pF  (hidden comment: *)
Capacitor, Ceramic (MLCC), 68pF, ±10%, 50V, C0G, ±10%, SMD 0402; Manufacturer: YAGEO; Manufacturer Part Number: CC0402KRNPO9BN680; Package Size: 0402; JLCPCB Basic Part: No; JLCPCB Part Number: C3907932; Supplier 1: LCSC; Category: Capacitors - MLCC; Supplier Part Number 1: C3907932; Tolerance: ±10%; Voltage Rating: 50V; Temperature Coefficient: C0G; RoHS: Yes; ComponentLink1Description: Datasheet; ComponentLink1URL: https://wmsc.lcsc.com/wmsc/upload/file/pdf/v2/lcsc/2311211121_YAGEO-CC0402KRNPO9BN680_C3907932.pdf; ComponentLink2Description: JLCPCB Part URL; ComponentLink2URL: https://jlcpcb.com/partdetail/C3907932; ComponentLink3Description: LCSC Part URL; ComponentLink3URL: https://lcsc.com/product-detail/Multilayer-Ceramic-Capacitors-MLCC---SMD-SMT_YAGEO-YAGEO-CC0402KRNPO9BN680_C3907932.html
footprint CAP-0402 (0402 (1005M) Capacitor)
pins: 1, 2

## CC0402KRNPO9BN820
designator C?  Capacitance: 82pF  (hidden comment: *)
Capacitor, Ceramic (MLCC), 82pF, ±10%, 50V, NP0, ±10%, SMD 0402; Manufacturer: YAGEO; Manufacturer Part Number: CC0402KRNPO9BN820; Package Size: 0402; JLCPCB Basic Part: No; JLCPCB Part Number: C576719; Supplier 1: LCSC; Category: Capacitors - MLCC; Supplier Part Number 1: C576719; Tolerance: ±10%; Voltage Rating: 50V; Temperature Coefficient: NP0; RoHS: Yes; ComponentLink1Description: Datasheet; ComponentLink1URL: https://wmsc.lcsc.com/wmsc/upload/file/pdf/v2/lcsc/2401221728_YAGEO-CC0402KRNPO9BN820_C576719.pdf; ComponentLink2Description: JLCPCB Part URL; ComponentLink2URL: https://jlcpcb.com/partdetail/C576719; ComponentLink3Description: LCSC Part URL; ComponentLink3URL: https://lcsc.com/product-detail/Multilayer-Ceramic-Capacitors-MLCC---SMD-SMT_YAGEO-YAGEO-CC0402KRNPO9BN820_C576719.html
footprint CAP-0402 (0402 (1005M) Capacitor)
pins: 1, 2

## CC0402KRX5R5BB103
designator C?  Capacitance: 10nF  (hidden comment: *)
Capacitor, Ceramic (MLCC), 10nF, ±10%, 6.3V, X5R, ±10%, SMD 0402; Manufacturer: YAGEO; Manufacturer Part Number: CC0402KRX5R5BB103; Package Size: 0402; JLCPCB Basic Part: No; JLCPCB Part Number: C1853984; Supplier 1: LCSC; Category: Capacitors - MLCC; Supplier Part Number 1: C1853984; Tolerance: ±10%; Voltage Rating: 6.3V; Temperature Coefficient: X5R; RoHS: Yes; ComponentLink1Description: Datasheet; ComponentLink1URL: https://wmsc.lcsc.com/wmsc/upload/file/pdf/v2/lcsc/2407081117_YAGEO-CC0402KRX5R5BB103_C1853984.pdf; ComponentLink2Description: JLCPCB Part URL; ComponentLink2URL: https://jlcpcb.com/partdetail/C1853984; ComponentLink3Description: LCSC Part URL; ComponentLink3URL: https://lcsc.com/product-detail/Multilayer-Ceramic-Capacitors-MLCC---SMD-SMT_YAGEO-YAGEO-CC0402KRX5R5BB103_C1853984.html
footprint CAP-0402 (0402 (1005M) Capacitor)
pins: 1, 2

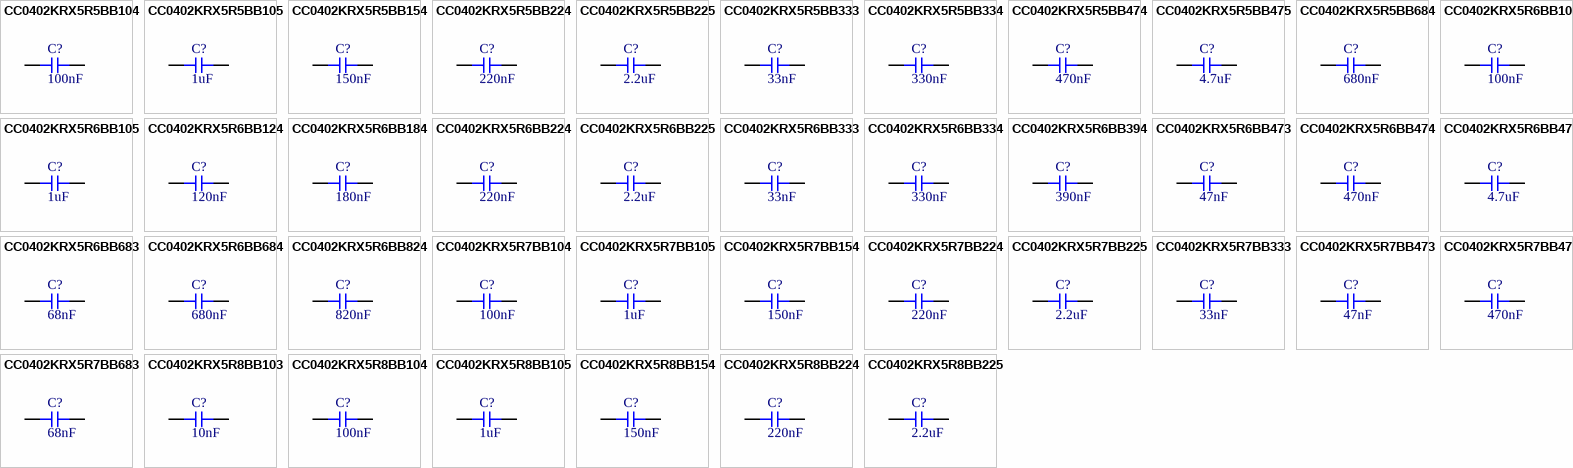
[diagram p37: symbols CC0402KRX5R5BB104 to CC0402KRX5R8BB225]

## CC0402KRX5R5BB104
designator C?  Capacitance: 100nF  (hidden comment: *)
Capacitor, Ceramic (MLCC), 100nF, ±10%, 6.3V, X5R, ±10%, SMD 0402; Manufacturer: YAGEO; Manufacturer Part Number: CC0402KRX5R5BB104; Package Size: 0402; JLCPCB Basic Part: No; JLCPCB Part Number: C541405; Supplier 1: LCSC; Category: Capacitors - MLCC; Supplier Part Number 1: C541405; Tolerance: ±10%; Voltage Rating: 6.3V; Temperature Coefficient: X5R; RoHS: Yes; ComponentLink1Description: Datasheet; ComponentLink1URL: https://wmsc.lcsc.com/wmsc/upload/file/pdf/v2/lcsc/2407081117_YAGEO-CC0402KRX5R5BB104_C541405.pdf; ComponentLink2Description: JLCPCB Part URL; ComponentLink2URL: https://jlcpcb.com/partdetail/C541405; ComponentLink3Description: LCSC Part URL; ComponentLink3URL: https://lcsc.com/product-detail/Multilayer-Ceramic-Capacitors-MLCC---SMD-SMT_YAGEO-YAGEO-CC0402KRX5R5BB104_C541405.html
footprint CAP-0402 (0402 (1005M) Capacitor)
pins: 1, 2

## CC0402KRX5R5BB105
designator C?  Capacitance: 1uF  (hidden comment: *)
Capacitor, Ceramic (MLCC), 1uF, ±10%, 6.3V, X5R, ±10%, SMD 0402; Manufacturer: YAGEO; Manufacturer Part Number: CC0402KRX5R5BB105; Package Size: 0402; JLCPCB Basic Part: No; JLCPCB Part Number: C106253; Supplier 1: LCSC; Category: Capacitors - MLCC; Supplier Part Number 1: C106253; Tolerance: ±10%; Voltage Rating: 6.3V; Temperature Coefficient: X5R; RoHS: Yes; ComponentLink1Description: Datasheet; ComponentLink1URL: https://wmsc.lcsc.com/wmsc/upload/file/pdf/v2/lcsc/2407081117_YAGEO-CC0402KRX5R5BB105_C106253.pdf; ComponentLink2Description: JLCPCB Part URL; ComponentLink2URL: https://jlcpcb.com/partdetail/C106253; ComponentLink3Description: LCSC Part URL; ComponentLink3URL: https://lcsc.com/product-detail/Multilayer-Ceramic-Capacitors-MLCC---SMD-SMT_YAGEO-YAGEO-CC0402KRX5R5BB105_C106253.html
footprint CAP-0402 (0402 (1005M) Capacitor)
pins: 1, 2

## CC0402KRX5R5BB154
designator C?  Capacitance: 150nF  (hidden comment: *)
Capacitor, Ceramic (MLCC), 150nF, ±10%, 6.3V, X5R, ±10%, SMD 0402; Manufacturer: YAGEO; Manufacturer Part Number: CC0402KRX5R5BB154; Package Size: 0402; JLCPCB Basic Part: No; JLCPCB Part Number: C726613; Supplier 1: LCSC; Category: Capacitors - MLCC; Supplier Part Number 1: C726613; Tolerance: ±10%; Voltage Rating: 6.3V; Temperature Coefficient: X5R; RoHS: Yes; ComponentLink1Description: Datasheet; ComponentLink1URL: https://wmsc.lcsc.com/wmsc/upload/file/pdf/v2/lcsc/2407081117_YAGEO-CC0402KRX5R5BB154_C726613.pdf; ComponentLink2Description: JLCPCB Part URL; ComponentLink2URL: https://jlcpcb.com/partdetail/C726613; ComponentLink3Description: LCSC Part URL; ComponentLink3URL: https://lcsc.com/product-detail/Multilayer-Ceramic-Capacitors-MLCC---SMD-SMT_YAGEO-YAGEO-CC0402KRX5R5BB154_C726613.html
footprint CAP-0402 (0402 (1005M) Capacitor)
pins: 1, 2

## CC0402KRX5R5BB224
designator C?  Capacitance: 220nF  (hidden comment: *)
Capacitor, Ceramic (MLCC), 220nF, ±10%, 6.3V, X5R, ±10%, SMD 0402; Manufacturer: YAGEO; Manufacturer Part Number: CC0402KRX5R5BB224; Package Size: 0402; JLCPCB Basic Part: No; JLCPCB Part Number: C272873; Supplier 1: LCSC; Category: Capacitors - MLCC; Supplier Part Number 1: C272873; Tolerance: ±10%; Voltage Rating: 6.3V; Temperature Coefficient: X5R; RoHS: Yes; ComponentLink1Description: Datasheet; ComponentLink1URL: https://wmsc.lcsc.com/wmsc/upload/file/pdf/v2/lcsc/2407081117_YAGEO-CC0402KRX5R5BB224_C272873.pdf; ComponentLink2Description: JLCPCB Part URL; ComponentLink2URL: https://jlcpcb.com/partdetail/C272873; ComponentLink3Description: LCSC Part URL; ComponentLink3URL: https://lcsc.com/product-detail/Multilayer-Ceramic-Capacitors-MLCC---SMD-SMT_YAGEO-YAGEO-CC0402KRX5R5BB224_C272873.html
footprint CAP-0402 (0402 (1005M) Capacitor)
pins: 1, 2

## CC0402KRX5R5BB225
designator C?  Capacitance: 2.2uF  (hidden comment: *)
Capacitor, Ceramic (MLCC), 2.2uF, ±10%, 6.3V, X5R, ±10%, SMD 0402; Manufacturer: YAGEO; Manufacturer Part Number: CC0402KRX5R5BB225; Package Size: 0402; JLCPCB Basic Part: No; JLCPCB Part Number: C541409; Supplier 1: LCSC; Category: Capacitors - MLCC; Supplier Part Number 1: C541409; Tolerance: ±10%; Voltage Rating: 6.3V; Temperature Coefficient: X5R; RoHS: Yes; ComponentLink1Description: Datasheet; ComponentLink1URL: https://wmsc.lcsc.com/wmsc/upload/file/pdf/v2/lcsc/2407081117_YAGEO-CC0402KRX5R5BB225_C541409.pdf; ComponentLink2Description: JLCPCB Part URL; ComponentLink2URL: https://jlcpcb.com/partdetail/C541409; ComponentLink3Description: LCSC Part URL; ComponentLink3URL: https://lcsc.com/product-detail/Multilayer-Ceramic-Capacitors-MLCC---SMD-SMT_YAGEO-YAGEO-CC0402KRX5R5BB225_C541409.html
footprint CAP-0402 (0402 (1005M) Capacitor)
pins: 1, 2

## CC0402KRX5R5BB333
designator C?  Capacitance: 33nF  (hidden comment: *)
Capacitor, Ceramic (MLCC), 33nF, ±10%, 6.3V, X5R, ±10%, SMD 0402; Manufacturer: YAGEO; Manufacturer Part Number: CC0402KRX5R5BB333; Package Size: 0402; JLCPCB Basic Part: No; JLCPCB Part Number: C541395; Supplier 1: LCSC; Category: Capacitors - MLCC; Supplier Part Number 1: C541395; Tolerance: ±10%; Voltage Rating: 6.3V; Temperature Coefficient: X5R; RoHS: Yes; ComponentLink1Description: Datasheet; ComponentLink1URL: https://wmsc.lcsc.com/wmsc/upload/file/pdf/v2/lcsc/2407081117_YAGEO-CC0402KRX5R5BB333_C541395.pdf; ComponentLink2Description: JLCPCB Part URL; ComponentLink2URL: https://jlcpcb.com/partdetail/C541395; ComponentLink3Description: LCSC Part URL; ComponentLink3URL: https://lcsc.com/product-detail/Multilayer-Ceramic-Capacitors-MLCC---SMD-SMT_YAGEO-YAGEO-CC0402KRX5R5BB333_C541395.html
footprint CAP-0402 (0402 (1005M) Capacitor)
pins: 1, 2

## CC0402KRX5R5BB334
designator C?  Capacitance: 330nF  (hidden comment: *)
Capacitor, Ceramic (MLCC), 330nF, ±10%, 6.3V, X5R, ±10%, SMD 0402; Manufacturer: YAGEO; Manufacturer Part Number: CC0402KRX5R5BB334; Package Size: 0402; JLCPCB Basic Part: No; JLCPCB Part Number: C272884; Supplier 1: LCSC; Category: Capacitors - MLCC; Supplier Part Number 1: C272884; Tolerance: ±10%; Voltage Rating: 6.3V; Temperature Coefficient: X5R; RoHS: Yes; ComponentLink1Description: Datasheet; ComponentLink1URL: https://wmsc.lcsc.com/wmsc/upload/file/pdf/v2/lcsc/2407081117_YAGEO-CC0402KRX5R5BB334_C272884.pdf; ComponentLink2Description: JLCPCB Part URL; ComponentLink2URL: https://jlcpcb.com/partdetail/C272884; ComponentLink3Description: LCSC Part URL; ComponentLink3URL: https://lcsc.com/product-detail/Multilayer-Ceramic-Capacitors-MLCC---SMD-SMT_YAGEO-YAGEO-CC0402KRX5R5BB334_C272884.html
footprint CAP-0402 (0402 (1005M) Capacitor)
pins: 1, 2

## CC0402KRX5R5BB474
designator C?  Capacitance: 470nF  (hidden comment: *)
Capacitor, Ceramic (MLCC), 470nF, ±10%, 6.3V, X5R, ±10%, SMD 0402; Manufacturer: YAGEO; Manufacturer Part Number: CC0402KRX5R5BB474; Package Size: 0402; JLCPCB Basic Part: No; JLCPCB Part Number: C107012; Supplier 1: LCSC; Category: Capacitors - MLCC; Supplier Part Number 1: C107012; Tolerance: ±10%; Voltage Rating: 6.3V; Temperature Coefficient: X5R; RoHS: Yes; ComponentLink1Description: Datasheet; ComponentLink1URL: https://wmsc.lcsc.com/wmsc/upload/file/pdf/v2/lcsc/2407081117_YAGEO-CC0402KRX5R5BB474_C107012.pdf; ComponentLink2Description: JLCPCB Part URL; ComponentLink2URL: https://jlcpcb.com/partdetail/C107012; ComponentLink3Description: LCSC Part URL; ComponentLink3URL: https://lcsc.com/product-detail/Multilayer-Ceramic-Capacitors-MLCC---SMD-SMT_YAGEO-YAGEO-CC0402KRX5R5BB474_C107012.html
footprint CAP-0402 (0402 (1005M) Capacitor)
pins: 1, 2

## CC0402KRX5R5BB475
designator C?  Capacitance: 4.7uF  (hidden comment: *)
Capacitor, Ceramic (MLCC), 4.7uF, ±10%, 6.3V, X5R, ±10%, SMD 0402; Manufacturer: YAGEO; Manufacturer Part Number: CC0402KRX5R5BB475; Package Size: 0402; JLCPCB Basic Part: No; JLCPCB Part Number: C541466; Supplier 1: LCSC; Category: Capacitors - MLCC; Supplier Part Number 1: C541466; Tolerance: ±10%; Voltage Rating: 6.3V; Temperature Coefficient: X5R; RoHS: Yes; ComponentLink1Description: Datasheet; ComponentLink1URL: https://wmsc.lcsc.com/wmsc/upload/file/pdf/v2/lcsc/2407081117_YAGEO-CC0402KRX5R5BB475_C541466.pdf; ComponentLink2Description: JLCPCB Part URL; ComponentLink2URL: https://jlcpcb.com/partdetail/C541466; ComponentLink3Description: LCSC Part URL; ComponentLink3URL: https://lcsc.com/product-detail/Multilayer-Ceramic-Capacitors-MLCC---SMD-SMT_YAGEO-YAGEO-CC0402KRX5R5BB475_C541466.html
footprint CAP-0402 (0402 (1005M) Capacitor)
pins: 1, 2

## CC0402KRX5R5BB684
designator C?  Capacitance: 680nF  (hidden comment: *)
Capacitor, Ceramic (MLCC), 680nF, ±10%, 6.3V, X5R, ±10%, SMD 0402; Manufacturer: YAGEO; Manufacturer Part Number: CC0402KRX5R5BB684; Package Size: 0402; JLCPCB Basic Part: No; JLCPCB Part Number: C576721; Supplier 1: LCSC; Category: Capacitors - MLCC; Supplier Part Number 1: C576721; Tolerance: ±10%; Voltage Rating: 6.3V; Temperature Coefficient: X5R; RoHS: Yes; ComponentLink1Description: Datasheet; ComponentLink1URL: https://wmsc.lcsc.com/wmsc/upload/file/pdf/v2/lcsc/2407081117_YAGEO-CC0402KRX5R5BB684_C576721.pdf; ComponentLink2Description: JLCPCB Part URL; ComponentLink2URL: https://jlcpcb.com/partdetail/C576721; ComponentLink3Description: LCSC Part URL; ComponentLink3URL: https://lcsc.com/product-detail/Multilayer-Ceramic-Capacitors-MLCC---SMD-SMT_YAGEO-YAGEO-CC0402KRX5R5BB684_C576721.html
footprint CAP-0402 (0402 (1005M) Capacitor)
pins: 1, 2

## CC0402KRX5R6BB104
designator C?  Capacitance: 100nF  (hidden comment: *)
Capacitor, Ceramic (MLCC), 100nF, ±10%, 10V, X5R, ±10%, SMD 0402; Manufacturer: YAGEO; Manufacturer Part Number: CC0402KRX5R6BB104; Package Size: 0402; JLCPCB Basic Part: No; JLCPCB Part Number: C129131; Supplier 1: LCSC; Category: Capacitors - MLCC; Supplier Part Number 1: C129131; Tolerance: ±10%; Voltage Rating: 10V; Temperature Coefficient: X5R; RoHS: Yes; ComponentLink1Description: Datasheet; ComponentLink1URL: https://wmsc.lcsc.com/wmsc/upload/file/pdf/v2/lcsc/2407081117_YAGEO-CC0402KRX5R6BB104_C129131.pdf; ComponentLink2Description: JLCPCB Part URL; ComponentLink2URL: https://jlcpcb.com/partdetail/C129131; ComponentLink3Description: LCSC Part URL; ComponentLink3URL: https://lcsc.com/product-detail/Multilayer-Ceramic-Capacitors-MLCC---SMD-SMT_YAGEO-YAGEO-CC0402KRX5R6BB104_C129131.html
footprint CAP-0402 (0402 (1005M) Capacitor)
pins: 1, 2